# Altium footprint library Library.PcbLib: 48 footprints (part 3 of 3)
Each footprint in its own frame and in the unit in brackets; x right, y up, seen from the top. Pads: shape width x height; smd on the part's side, far side on the other; paste and mask are expansions set on the pad; w line width, h text height; cw(c..) or ccw(c..) is an arc to the next point about the centre after c.
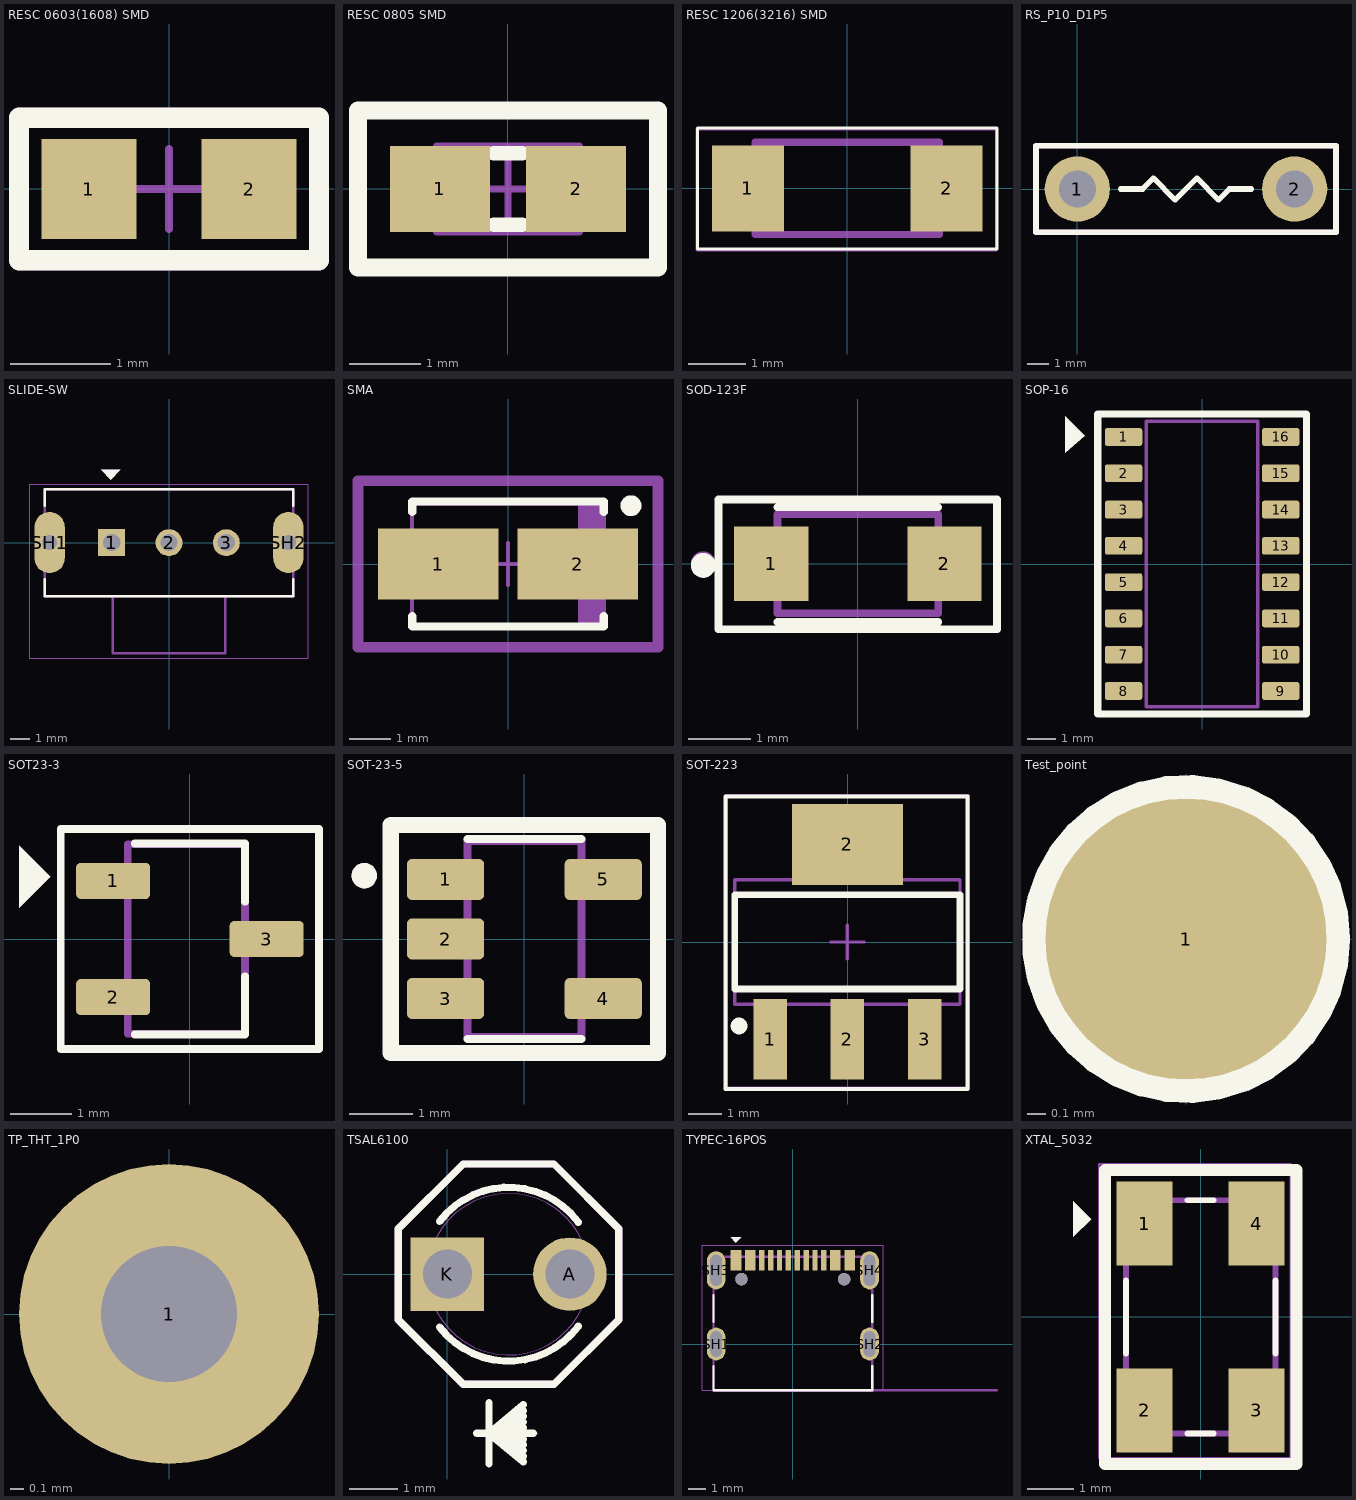
[diagram p2: the footprints below, top view; thin cyan lines are the x and y axes]

## RESC 0603(1608) SMD [mm] "Chip Resistor 0603"
height 0.55
pads (2):
  rect 0.95x1 smd: 1(-0.8,0) 2(0.8,0)
Top Overlay:
  lines w0.203: -1.499,-0.711 1.499,-0.711 1.499,0.711 -1.499,0.711 -1.499,-0.711
Mechanical 1:
  lines w0.203: -1.499,-0.711 1.499,-0.711 1.499,0.711 -1.499,0.711 -1.499,-0.711
Top Courtyard:
  lines w0.203: -1.499,-0.711 1.499,-0.711 1.499,0.711 -1.499,0.711 -1.499,-0.711
Top Assembly:
  text ".Designator" at 0,0.188 h1
Top Component Center:
  lines w0.076: -0.4,0 0.4,0 ; 0,-0.4 0,0.4
3D body "STD(0603) M(1608).STEP": height 0.45, standoff 0, extent -0.8,-0.4 0.8,0.4

## RESC 0805 SMD [mm]
height 0.5
pads (2):
  rect 1.4x1.2 smd: 1(-0.955,0) 2(0.955,0)
Top Overlay:
  lines w0.2: -0.2,-0.5 0.2,-0.5 ; -0.2,0.5 0.2,0.5
  lines w0.254: -2.1,-1.1 2.1,-1.1 2.1,1.1 -2.1,1.1 -2.1,-1.1
Top Courtyard:
  lines w0.05: -2.1,-1.1 2.1,-1.1 2.1,1.1 -2.1,1.1 -2.1,-1.1
  lines w0.1: -0.5,0 0.5,0 ; 0,-0.5 0,0.5
Top Assembly:
  lines w0.1: -1,-0.6 1,-0.6 1,0.6 -1,0.6 -1,-0.6
3D body "RESC 0805 SMD .step": height 0.5, standoff 0, extent -1,-0.6 1,0.6

## RESC 1206(3216) SMD [mm]
pads (2):
  rect 1.25x1.5 smd: 1(-1.725,0) 2(1.725,0)
Top Overlay:
  lines w0.05: -2.6,-1.05 2.6,-1.05 2.6,1.05 -2.6,1.05 -2.6,-1.05
Mechanical 13:
  lines w0.127: -1.6,-0.8 -1.6,0.8 1.6,0.8 1.6,-0.8 -1.6,-0.8
Mechanical 15:
  lines w0.05: -2.606,-1.068 -2.606,1.032 2.594,1.032 2.594,-1.068 -2.606,-1.068
3D body "ERJ-U08F6800V.STEP": height 0.6, standoff 0, extent -1.652,-0.8 1.548,0.8

## RS_P10_D1P5 [mm]
pads (2):
  round 3 hole 1.7: 1(0,0) 2(10,0)
Top Overlay:
  lines w0.254: 2,0 3,0 ; 8,0 7,0 6.5,-0.5 ; 3,0 3.5,0.5 4.5,-0.5 ; 3,0 3,0 ; 4.5,-0.5 5.5,0.5 ; 4.5,-0.5 4.5,-0.5 ; 5.5,0.5 6.5,-0.5 ; 5.5,0.5 5.5,0.5 ; 6.5,-0.5 6.5,-0.5 ; -1.9,-2 11.9,-2 11.9,2 -1.9,2 -1.9,-2
Top Courtyard:
  lines w0.254: -1.9,-2 -1.9,2 11.9,2 11.9,-2 -1.9,-2

## SLIDE-SW [mm]
pads (5):
  rect 1.408x1.408 / inner round 1.408 / far side rect 1.408x1.408 hole 0.9 mask+0.102: 1(-3,0)
  round 1.408 hole 0.9 mask+0.102: 2(0,0) 3(3,0)
  oval 1.6x3.2 hole 0.8 square mask+0.102: SH1(-6.25,0) SH2(6.25,0)
Top Overlay:
  region: -3.556,3.81 -2.54,3.81 -3.048,3.302
  lines w0.127: -6.5,-1.92 -6.5,-2.8 -2.95,-2.8 2.95,-2.8 6.5,-2.8 6.5,-1.92 ; -6.5,1.92 -6.5,2.8 6.5,2.8 6.5,1.92
Mechanical 13:
  region: -3.556,3.81 -2.54,3.81 -3.048,3.302
  lines w0.127: -2.95,-2.8 2.95,-2.8 ; -2.95,-2.8 -6.5,-2.8 -6.5,2.8 6.5,2.8 6.5,-2.8 2.95,-2.8 ; -2.95,-2.8 -2.95,-5.8 2.95,-5.8 2.95,-2.8
Mechanical 15:
  lines w0.05: -7.3,-6.05 -7.3,3.05 7.3,3.05 7.3,-6.05 -7.3,-6.05
3D body "step_temp.STEP": height 6.04, standoff -2.96, extent -6.5,-5.842 6.5,2.758

## SMA [mm] "Molded Diode, 2-Leads, Body 4.30x2.61mm, IPC Low Density"
height 2.3
pads (2):
  rect 2.9x1.7 smd: 1(-1.675,0) 2(1.675,0)
Top Overlay:
  circle w0.25: c2.95,1.4 r0.125
  lines w0.2: -2.3,-1.25 -2.3,-1.5 2.3,-1.5 2.3,-1.25 ; -2.3,1.25 -2.3,1.5 2.3,1.5 2.3,1.25
Top Courtyard:
  lines w0.1: -0.5,0 0.5,0 ; 0,-0.5 0,0.5
  lines w0.254: -3.6,-2 -3.6,2 3.6,2 3.6,-2 -3.6,-2
Top Assembly:
  rectangle: 1.681,-1.46 2.3,1.46
  lines w0.1: -2.3,-1.46 -2.3,1.46 2.3,1.46 2.3,-1.46 -2.3,-1.46
3D body "SMA.step": height 2.3, standoff 0, extent -2.52,-1.46 2.52,1.46

## SOD-123F [mm]
pads (2):
  rect 1.2x1.2 smd paste-0.05: 1(-1.4,0) 2(1.4,0)
Top Overlay:
  circle w0.2: c-2.5,-0.027 r0.1
  lines w0.127: -1.3,-0.941 1.3,-0.941 ; -1.3,0.914 1.3,0.914 ; -2.25,-1.06 2.25,-1.06 2.25,1.04 -2.25,1.04 -2.25,-1.06
Mechanical 13:
  circle w0.2: c-2.5,0 r0.1
  lines w0.127: -1.3,-0.8 -1.3,0.8 1.3,0.8 1.3,-0.8 -1.3,-0.8
Mechanical 15:
  lines w0.05: -2.25,-1.05 -2.25,1.05 2.25,1.05 2.25,-1.05 -2.25,-1.05
3D body "step_temp.STEP": height 1.2, standoff 0, extent -1.75,-0.8 1.75,0.8

## SOP-16 [mm]
pads (16):
  rrect25% 1.31x0.62 smd: 1(-2.75,4.445) 2(-2.75,3.175) 3(-2.75,1.905) 4(-2.75,0.635) 5(-2.75,-0.635) 6(-2.75,-1.905) 7(-2.75,-3.175) 8(-2.75,-4.445) 9(2.75,-4.445) 10(2.75,-3.175) 11(2.75,-1.905) 12(2.75,-0.635) 13(2.75,0.635) 14(2.75,1.905) 15(2.75,3.175) 16(2.75,4.445)
Top Overlay:
  region: -4.784,3.895 -4.784,5.165 -4.106,4.487
  lines w0.254: -3.655,-5.25 -3.655,5.25 3.655,5.25 3.655,-5.25 -3.655,-5.25
Mechanical 13:
  lines w0.127: -1.95,-5 -1.95,5 1.95,5 1.95,-5 -1.95,-5
Mechanical 15:
  lines w0.05: -3.655,-5.25 -3.655,5.25 3.655,5.25 3.655,-5.25 -3.655,-5.25
3D body "step_temp.STEP": height 1.8, standoff 0, extent -3,-5 3,5

## SOT23-3 [mm]
pads (3):
  rrect25% 1.21x0.59 smd: 1(-1.255,0.95) 2(-1.255,-0.95) 3(1.255,0)
Top Overlay:
  region: -2.794,1.524 -2.794,0.508 -2.286,1.016
  lines w0.127: -0.9,-1.559 0.9,-1.559 0.9,-0.609 ; -0.9,1.559 0.9,1.559 0.9,0.609 ; -2.11,-1.8 -2.11,1.8 2.11,1.8 2.11,-1.8 -2.11,-1.8
Mechanical 13:
  region: -2.794,1.524 -2.794,0.508 -2.286,1.016
  lines w0.127: -1.016,-1.55 -1.016,1.55 0.9,1.55 0.9,-1.55 -1.016,-1.55
Mechanical 15:
  lines w0.05: -2.11,-1.8 2.11,-1.8 2.11,1.8 -2.11,1.8 -2.11,-1.8
3D body "SOT-23-3L_AOS.step": height 1.25, standoff 0, extent -1.524,-1.524 1.474,1.574

## SOT-23-5 [mm]
pads (5):
  rrect25% 1.22x0.65 smd: 1(-1.245,0.94) 2(-1.245,0) 3(-1.245,-0.94) 4(1.245,-0.94) 5(1.245,0.94)
Top Overlay:
  circle w0.2: c-2.527,1 r0.1
  lines w0.127: -0.9,-1.579 0.9,-1.579 ; -0.9,1.579 0.9,1.579
  lines w0.254: -2.11,-1.8 -2.11,1.8 2.11,1.8 2.11,-1.8 -2.11,-1.8
Mechanical 13:
  circle w0.2: c-2.527,1 r0.1
  lines w0.127: -0.9,-1.55 0.9,-1.55 0.9,1.55 -0.9,1.55 -0.9,-1.55
Mechanical 15:
  lines w0.05: -2.11,-1.8 2.11,-1.8 2.11,1.8 -2.11,1.8 -2.11,-1.8
3D body "step_temp.STEP": height 1.3, standoff 0, extent -1.397,-1.448 1.397,1.448

## SOT-223 [mm]
pads (4):
  rect 1x2.4 smd: 1(-2.306,-2.893) 2(-0.006,-2.893) 3(2.294,-2.893)
  rect 3.3x2.4 smd: 2(-0.006,2.907)
Top Overlay:
  circle w0.25: c-3.231,-2.493 r0.125
  lines w0.127: -3.631,-4.369 -3.631,4.331 3.569,4.331 3.569,-4.369 -3.631,-4.369
  lines w0.2: -3.356,-1.393 -3.356,1.407 3.344,1.407 3.344,-1.393 -3.356,-1.393
Mechanical 13:
  lines w0.1: -3.356,-1.843 -3.356,1.857 3.344,1.857 3.344,-1.843 -3.356,-1.843
Mechanical 15:
  lines w0.1: -0.506,0.007 0.494,0.007 ; -0.006,-0.493 -0.006,0.507 ; -3.606,-4.343 -3.606,4.357 3.594,4.357 3.594,-4.343 -3.606,-4.343
3D body "SW3DPS-SOT-223-DEFAULT.step": height 1.68, standoff 0, extent -3.256,-3.549 3.244,3.411

## Test_point [mm]
pads (1):
  round 1.5 smd: 1(0,0)
Top Overlay:
  circle w0.15: c0,0 r0.8

## TP_THT_1P0 [mm]
pads (1):
  round 2.2 hole 1: 1(0,0)

## TSAL6100 [mil]
pads (2):
  round 60 hole 40 paste-99999 mask+0: A(100,0)
  rect 60x60 hole 40 paste-99999 mask+0: K(0,0)
Top Overlay:
  lines w6: -6.42,-43.1 ccw(c50,0) 106.83,-42.55 ; -6.42,43.1 cw(c50,0) 106.83,42.55 ; 24,-130 70,-130 ; 34,-155 34,-105 ; 61.9,-153.25 34,-130 ; 61.9,-148.6 34,-130 ; 61.9,-143.95 34,-130 ; 61.9,-139.3 34,-130 ; 61.9,-134.65 34,-130 ; 61.9,-125.35 34,-130 ; 61.9,-120.7 34,-130 ; 61.9,-116.05 34,-130 ; 61.9,-111.4 34,-130 ; 61.9,-106.75 34,-130 ; -40,-37.06 12.94,-90 87.06,-90 140,-37.06 140,37.06 87.06,90 12.94,90 -40,37.06 -40,-37.06
Mechanical 13:
  circle w1: c50,0 r66
  lines w1: -41,-25 -41,25 ; 24,-130 74,-130 ; 64,-155 34,-130 ; 64,-150 34,-130 ; 64,-145 34,-130 ; 64,-140 34,-130 ; 64,-135 34,-130 ; 64,-125 34,-130 ; 64,-120 34,-130 ; 64,-115 34,-130 ; 64,-110 34,-130 ; 64,-105 34,-130
Mechanical 15:
  lines w6: -40,-37.06 12.94,-90 87.06,-90 140,-37.06 140,37.06 87.06,90 12.94,90 -40,37.06 -40,-37.06

## TYPEC-16POS [mm]
pads (18):
  rect 0.6x1.15 smd: A1_B12(-3.2,4.725) A4_B9(-2.4,4.725) A9_B4(2.4,4.725) A12_B1(3.2,4.725)
  rect 0.3x1.15 smd: A5(-1.25,4.725) A6(-0.25,4.725) A7(0.25,4.725) A8(1.25,4.725) B5(1.75,4.725) B6(0.75,4.725) B7(-0.75,4.725) B8(-1.75,4.725)
  oval 1.05x1.85 hole 0.65 slot 1.45 at 90 deg: SH1(-4.32,0) SH2(4.32,0)
  oval 1.05x2.15 hole 0.65 slot 1.75 at 90 deg: SH3(-4.32,4.15) SH4(4.32,4.15)
  round 0.7 hole 0.7 unplated: ""(-2.89,3.65) ""(2.89,3.65)
Top Overlay:
  region: -3.505,6.02 -2.896,6.02 -3.2,5.715
  lines w0.127: -4.47,-1.25 -4.47,-2.6 4.47,-2.6 4.47,-1.25 ; -4.47,1.25 -4.47,2.75 ; 4.47,1.25 4.47,2.75
Mechanical 13:
  lines w0.127: 11.5,-2.6 4.47,-2.6 ; -4.47,-2.6 4.47,-2.6 ; -4.47,-2.6 -4.47,4.91 4.47,4.91 4.47,-2.6 ; -4.47,-2.6 -4.47,-2.64 4.47,-2.64 4.47,-2.6
  text "PCB EDGE" at 5.5,-2.25 h0.81
Mechanical 15:
  lines w0.05: -5.095,-2.6 5.095,-2.6 5.095,5.55 -5.095,5.55 -5.095,-2.6
3D body "step_temp.STEP": height 3.41, standoff -1.1, extent -4.47,-2.762 4.47,5.048

## XTAL_5032 [mm]
pads (4):
  rect 1.2x1.8 smd: 1(-1.2,2) 2(-1.2,-2) 3(1.2,-2) 4(1.2,2)
Top Overlay:
  region: -2.73,2.476 -2.73,1.714 -2.349,2.095
  lines w0.127: -1.6,-0.78 -1.6,0.78 ; -0.28,-2.5 0.28,-2.5 ; -0.28,2.5 0.28,2.5 ; 1.6,-0.78 1.6,0.78
  lines w0.254: -2.05,-3.15 -2.05,3.15 2.05,3.15 2.05,-3.15 -2.05,-3.15
Mechanical 13:
  lines w0.127: -1.6,-2.5 1.6,-2.5 1.6,2.5 -1.6,2.5 -1.6,-2.5
Mechanical 15:
  lines w0.05: -2.177,-3.023 1.923,-3.023 1.923,3.277 -2.177,3.277 -2.177,-3.023
3D body "step_temp.STEP": height 1.1, standoff -0.01, extent -1.587,-2.5 1.587,2.5